# Altium footprint library packages.PcbLib: 33 footprints (part 3 of 3)
Each footprint in its own frame and in the unit in brackets; x right, y up, seen from the top. Pads: shape width x height; smd on the part's side, far side on the other; paste and mask are expansions set on the pad; w line width, h text height; cw(c..) or ccw(c..) is an arc to the next point about the centre after c.
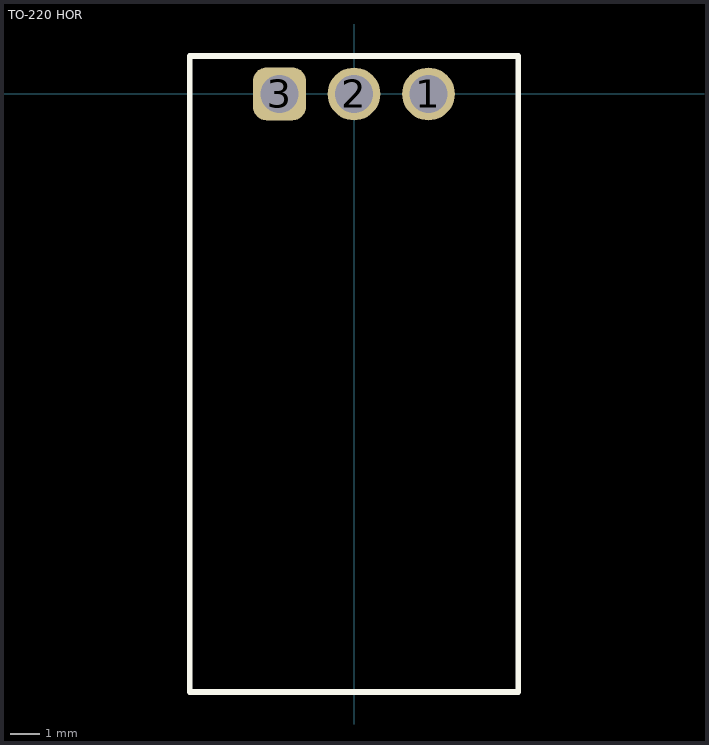
[diagram p2: the footprint, top view; thin cyan lines are the x and y axes]

## TO-220 HOR [mm] "TO-220 package"
height 2.4
pads (3):
  round 1.8 hole 1.3: 1(2.54,0) 2(0,0)
  rrect50% 1.8x1.8 hole 1.3: 3(-2.54,0)
Top Overlay:
  lines w0.2: -5.6,-20.4 5.6,-20.4 5.6,1.3 -5.6,1.3 -5.6,-20.4
3D body "TO-220_horizontal_line.stp": height 4.65, standoff -3, extent -5.25,-20.05 5.25,0.2